# Altium footprint library PCB_ConnectorHDR.PcbLib: 221 footprints (part 8 of 14)
Each footprint in its own frame and in the unit in brackets; x right, y up, seen from the top. Pads: shape width x height; smd on the part's side, far side on the other; paste and mask are expansions set on the pad; w line width, h text height; cw(c..) or ccw(c..) is an arc to the next point about the centre after c.
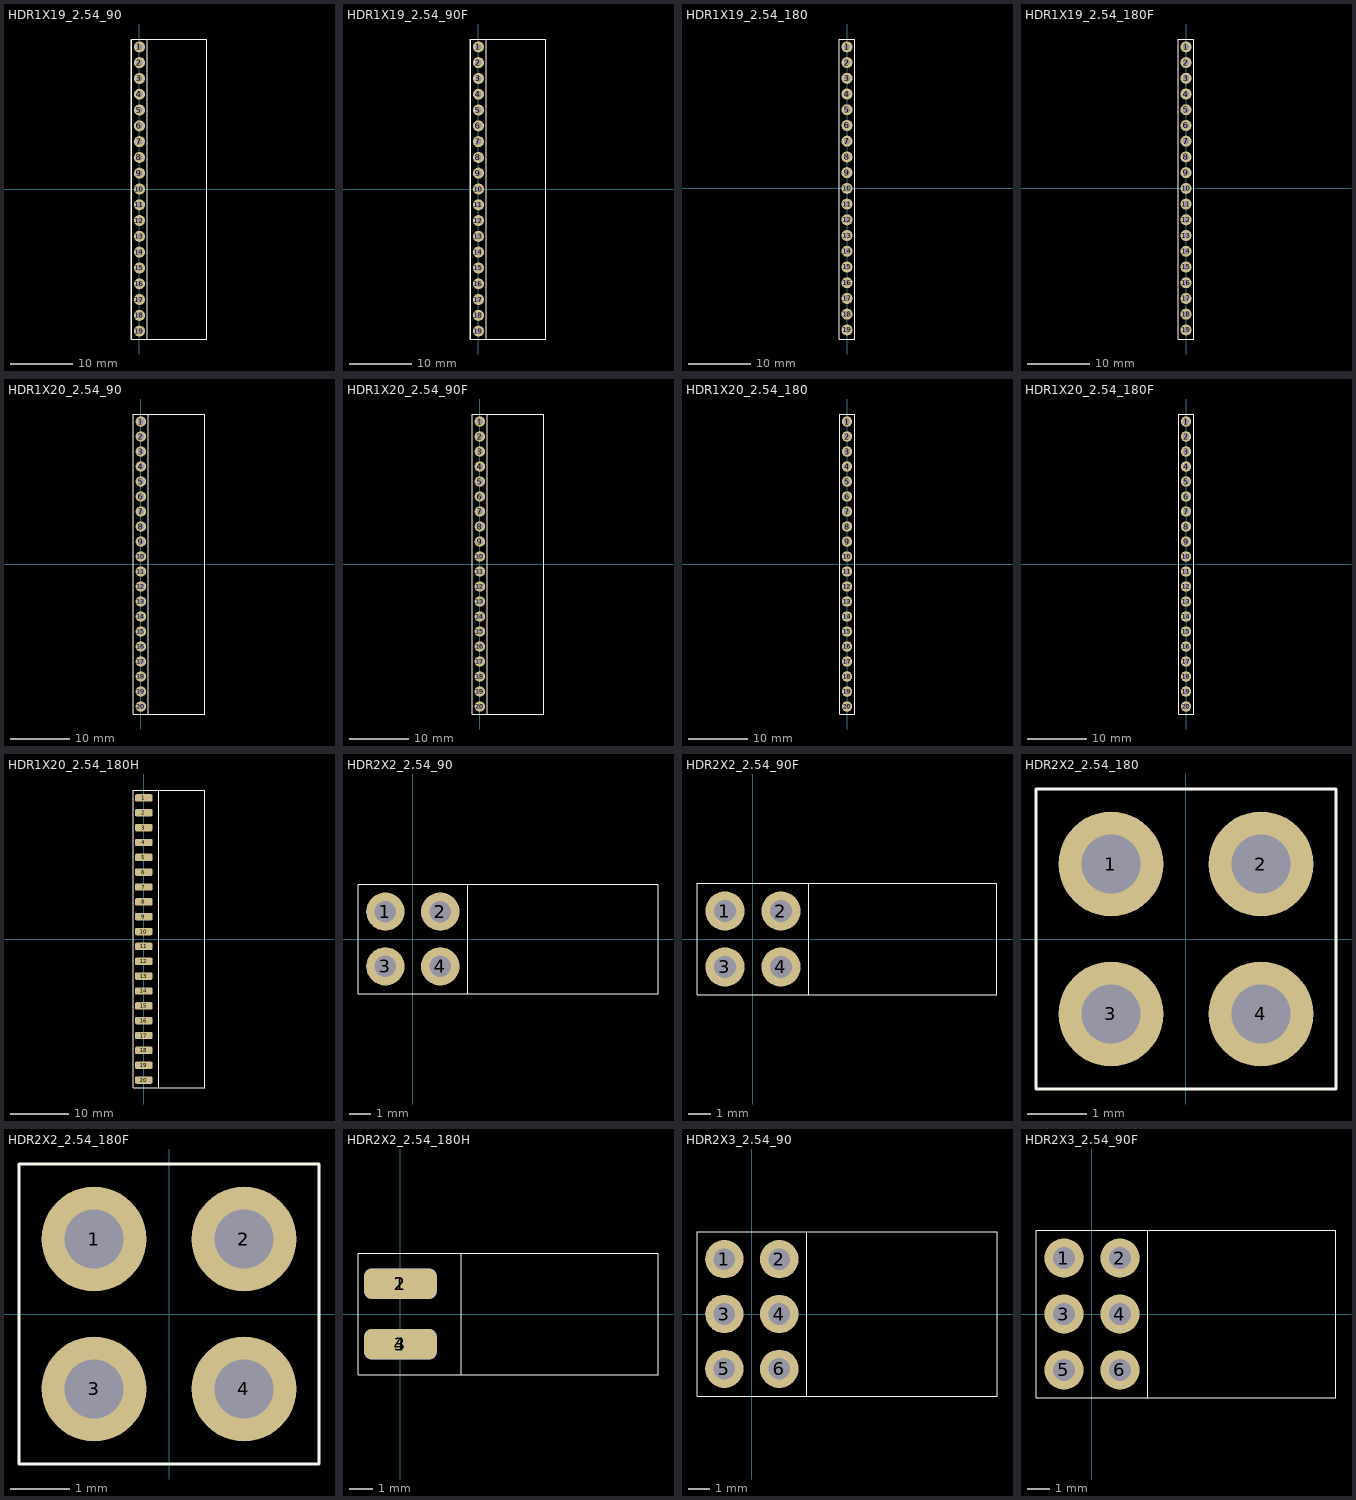
[diagram p7: the footprints below, top view; thin cyan lines are the x and y axes]

## HDR1X19_2.54_90 [mil]
height 169.29
pads (19):
  round 70 hole 39.37: 1(0,900) 2(0,800) 3(0,700) 4(0,600) 5(0,500) 6(0,400) 7(0,300) 8(0,200) 9(0,100) 10(0,0) 11(0,-100) 12(0,-200) 13(0,-300) 14(0,-400) 15(0,-500) 16(0,-600) 17(0,-700) 18(0,-800) 19(0,-900)
Top Overlay:
  lines w2: -51,-150 -51,950 ; -51,950 -51,-950 425,-950 425,950 -51,950 ; -50,-950 -50,950 ; -50,-950 50,-950 ; -50,-950 -50,950 ; -50,-950 50,-950 ; -50,950 50,950 ; -50,950 50,950 ; 50,-950 50,950 ; 50,-950 50,950
3D body "pin_header_aw140-ea-g19g.stp": height 98.93, standoff -93.99, extent -13,-946.13 425.58,946

## HDR1X19_2.54_90F [mil]
height 169.29
pads (19):
  round 70 hole 39.37: 1(0,900) 2(0,800) 3(0,700) 4(0,600) 5(0,500) 6(0,400) 7(0,300) 8(0,200) 9(0,100) 10(0,0) 11(0,-100) 12(0,-200) 13(0,-300) 14(0,-400) 15(0,-500) 16(0,-600) 17(0,-700) 18(0,-800) 19(0,-900)
Top Overlay:
  lines w2: -51,-150 -51,950 ; -51,950 -51,-950 425,-950 425,950 -51,950 ; -50,-950 -50,950 ; -50,-950 50,-950 ; -50,-950 -50,950 ; -50,-950 50,-950 ; -50,950 50,950 ; -50,950 50,950 ; 50,-950 50,950 ; 50,-950 50,950
3D body "female_header_a-bl254-ea-g19d.stp": height 98.93, standoff -125.48, extent -8,-954.84 388.06,955

## HDR1X19_2.54_180 [mil]
height 169.29
pads (19):
  round 70 hole 39.37: 1(0,900) 2(0,800) 3(0,700) 4(0,600) 5(0,500) 6(0,400) 7(0,300) 8(0,200) 9(0,100) 10(0,0) 11(0,-100) 12(0,-200) 13(0,-300) 14(0,-400) 15(0,-500) 16(0,-600) 17(0,-700) 18(0,-800) 19(0,-900)
Top Overlay:
  lines w2: -50,-958 50,-958 ; -50,-958 -50,950 ; -50,-958 50,-958 ; -50,-958 -50,950 ; -50,950 50,950 ; -50,950 50,950 ; 50,-958 50,950 ; 50,-958 50,950
3D body "pin_header_aw140-eg-g19d.stp": height 322.83, standoff -118.11, extent -50.18,-954 48.18,946

## HDR1X19_2.54_180F [mil]
height 169.29
pads (19):
  round 70 hole 39.37: 1(0,900) 2(0,800) 3(0,700) 4(0,600) 5(0,500) 6(0,400) 7(0,300) 8(0,200) 9(0,100) 10(0,0) 11(0,-100) 12(0,-200) 13(0,-300) 14(0,-400) 15(0,-500) 16(0,-600) 17(0,-700) 18(0,-800) 19(0,-900)
Top Overlay:
  lines w2: -50,-958 -50,950 ; -50,-958 50,-958 ; -50,-958 -50,950 ; -50,-958 50,-958 ; -50,950 50,950 ; -50,950 50,950 ; 50,-958 50,950 ; 50,-958 50,950
3D body "female_header_a-bl254-eg-g19d.stp": height 334.65, standoff -125.98, extent -49.21,-954.84 49.21,955

## HDR1X20_2.54_90 [mil]
height 169.29
pads (20):
  round 70 hole 39.37: 1(0,950) 2(0,850) 3(0,750) 4(0,650) 5(0,550) 6(0,450) 7(0,350) 8(0,250) 9(0,150) 10(0,50) 11(0,-50) 12(0,-150) 13(0,-250) 14(0,-350) 15(0,-450) 16(0,-550) 17(0,-650) 18(0,-750) 19(0,-850) 20(0,-950)
Top Overlay:
  lines w2: -51,-100 -51,1000 ; -51,1000 -51,-1000 425,-1000 425,1000 -51,1000 ; -50,-1000 -50,1000 ; -50,-1000 50,-1000 ; -50,-1000 -50,1000 ; -50,-1000 50,-1000 ; -50,1000 50,1000 ; -50,1000 50,1000 ; 50,-1000 50,1000 ; 50,-1000 50,1000
3D body "pin_header_aw140-ea-g20g.stp": height 98.93, standoff -93.99, extent -13,-995.13 425.58,997

## HDR1X20_2.54_90F [mil]
height 169.29
pads (20):
  round 70 hole 39.37: 1(0,950) 2(0,850) 3(0,750) 4(0,650) 5(0,550) 6(0,450) 7(0,350) 8(0,250) 9(0,150) 10(0,50) 11(0,-50) 12(0,-150) 13(0,-250) 14(0,-350) 15(0,-450) 16(0,-550) 17(0,-650) 18(0,-750) 19(0,-850) 20(0,-950)
Top Overlay:
  lines w2: -51,-100 -51,1000 ; -51,1000 -51,-1000 425,-1000 425,1000 -51,1000 ; -50,-1000 -50,1000 ; -50,-1000 50,-1000 ; -50,-1000 -50,1000 ; -50,-1000 50,-1000 ; -50,1000 50,1000 ; -50,1000 50,1000 ; 50,-1000 50,1000 ; 50,-1000 50,1000
3D body "female_header_a-bl254-ea-g20d.stp": height 98.93, standoff -125.48, extent -8,-1004.84 388.06,1005

## HDR1X20_2.54_180 [mil]
height 169.29
pads (20):
  round 70 hole 39.37: 1(0,950) 2(0,850) 3(0,750) 4(0,650) 5(0,550) 6(0,450) 7(0,350) 8(0,250) 9(0,150) 10(0,50) 11(0,-50) 12(0,-150) 13(0,-250) 14(0,-350) 15(0,-450) 16(0,-550) 17(0,-650) 18(0,-750) 19(0,-850) 20(0,-950)
Top Overlay:
  lines w2: -50,-1000 -50,1000 ; -50,-1000 50,-1000 ; -50,-1000 -50,1000 ; -50,-1000 50,-1000 ; -50,1000 50,1000 ; -50,1000 50,1000 ; 50,-1000 50,1000 ; 50,-1000 50,1000
3D body "pin_header_aw140-eg-g20d.stp": height 322.83, standoff -118.11, extent -49.32,-1001.06 49.05,998.94

## HDR1X20_2.54_180F [mil]
height 169.29
pads (20):
  round 70 hole 39.37: 1(0,950) 2(0,850) 3(0,750) 4(0,650) 5(0,550) 6(0,450) 7(0,350) 8(0,250) 9(0,150) 10(0,50) 11(0,-50) 12(0,-150) 13(0,-250) 14(0,-350) 15(0,-450) 16(0,-550) 17(0,-650) 18(0,-750) 19(0,-850) 20(0,-950)
Top Overlay:
  lines w2: -50,-1000 -50,1000 ; -50,-1000 50,-1000 ; -50,-1000 -50,1000 ; -50,-1000 50,-1000 ; -50,1000 50,1000 ; -50,1000 50,1000 ; 50,-1000 50,1000 ; 50,-1000 50,1000
3D body "female_header_a-bl254-eg-g20d.stp": height 334.65, standoff -125.98, extent -49.21,-1004.84 49.21,1005

## HDR1X20_2.54_180H [mil]
height 169.29
pads (20):
  rrect50% 120x50 smd: 1(0,950) 2(0,850) 3(0,750) 4(0,650) 5(0,550) 6(0,450) 7(0,350) 8(0,250) 9(0,150) 10(0,50) 11(0,-50) 12(0,-150) 13(0,-250) 14(0,-350) 15(0,-450) 16(0,-550) 17(0,-650) 18(0,-750) 19(0,-850) 20(0,-950)
Top Overlay:
  lines w2: -70,-1000 -70,1000 ; -70,-1000 410,-1000 410,1000 -70,1000 ; -70,-1000 -70,1000 ; -70,-1000 100,-1000 100,1000 -70,1000
3D body "pin_header_aw140-eg-g20d.stp": height 49.32, standoff -49.05, extent -35,-1000 405.94,1000

## HDR2X2_2.54_90 [mil]
height 169.29
pads (4):
  round 70 hole 39.37: 1(-50,50) 2(50,50) 3(-50,-50) 4(50,-50)
Top Overlay:
  lines w2: -100,-100 -100,100 ; -100,-100 100,-100 100,100 -100,100 ; -100,-100 -100,100 ; -100,-100 447,-100 447,100 -100,100
3D body "pin_header_awl254-da-g04d.stp": height 198.43, standoff -116.54, extent -60,-100 447.09,100

## HDR2X2_2.54_90F [mil]
height 169.29
pads (4):
  round 70 hole 39.37: 1(-50,50) 2(50,50) 3(-50,-50) 4(50,-50)
Top Overlay:
  lines w2: -100,-100 -100,100 ; -100,-100 100,-100 100,100 -100,100 ; -100,-100 436,-100 436,100 -100,100 ; -100,-100 -100,100
3D body "female_header_a-bl254-da-g04d.stp": height 198.43, standoff -124.41, extent -60,-104.92 436.06,104.92

## HDR2X2_2.54_180 [mil]
height 169.29
pads (4):
  round 70 hole 39.37: 1(-50,50) 2(50,50) 3(-50,-50) 4(50,-50)
Top Overlay:
  lines w2: -100,-100 100.01,-100 ; -100,-100 -100,100 ; -100,-100 -100,100 ; -100,-100 100,-100 ; -100,100 100,100 ; -100,100 100,100 ; 100.01,-100 100.01,100 ; 100,-100 100,100
3D body "pin_header_awl254-dg-g04d.stp": height 334.65, standoff -118.11, extent -99.99,-100 100.01,100

## HDR2X2_2.54_180F [mil]
height 169.29
pads (4):
  round 70 hole 39.37: 1(-50,50) 2(50,50) 3(-50,-50) 4(50,-50)
Top Overlay:
  lines w2: -100,-100 -100,100 ; -100,-100 100,-100 ; -100,-100 100,-100 ; -100,-100 -100,100 ; -100,100 100,100 ; -100,100 100,100 ; 100,-100 100,100 ; 100,-100 100,100
3D body "female_header_a-bl254-dg-g04d.stp": height 334.65, standoff -125.98, extent -98.42,-104.93 98.43,104.92

## HDR2X2_2.54_180H [mil]
height 169.29
pads (4):
  rrect50% 120x50 smd: 1(0,50) 3(0,-50)
  rrect50% 120x50 smd far side: 2(0,50) 4(0,-50)
Top Overlay:
  lines w2: -70,-100 -70,100 ; -70,-100 100,-100 ; -70,-100 -70,100 ; -70,-100 425,-100 425,100 -70,100 ; -70,-100 -70,100 ; -70,-100 100,-100 ; -70,100 100,100 ; -70,100 100,100 ; 100,-100 100,100 ; 100,-100 100,100
3D body "pin_header_awl254-dg-g04d.stp": height 100, standoff -100, extent -38.11,-99.99 414.65,100.01

## HDR2X3_2.54_90 [mil]
height 169.29
pads (6):
  round 70 hole 39.37: 1(-50,100) 2(50,100) 3(-50,0) 4(50,0) 5(-50,-100) 6(50,-100)
Top Overlay:
  lines w2: -100,-150 -100,150 ; -100,-150 447,-150 447,150 -100,150 ; -100,-150 100,-150 100,150 -100,150 ; -100,-150 -100,150
3D body "pin_header_awl254-da-g06d.stp": height 198.43, standoff -116.54, extent -60,-150 447.09,150

## HDR2X3_2.54_90F [mil]
height 169.29
pads (6):
  round 70 hole 39.37: 1(-50,100) 2(50,100) 3(-50,0) 4(50,0) 5(-50,-100) 6(50,-100)
Top Overlay:
  lines w2: -100,-150 436,-150 436,150 -100,150 ; -100,-150 -100,150 ; -100,-150 100,-150 100,150 -100,150 ; -100,-150 -100,150
3D body "female_header_a-bl254-da-g06d.stp": height 198.43, standoff -124.41, extent -60,-154.92 436.06,154.92